# Altium footprint library Semicon-Discrete.pcblib: 205 footprints (part 13 of 13)
Each footprint in its own frame and in the unit in brackets; x right, y up, seen from the top. Pads: shape width x height; smd on the part's side, far side on the other; paste and mask are expansions set on the pad; w line width, h text height; cw(c..) or ccw(c..) is an arc to the next point about the centre after c.
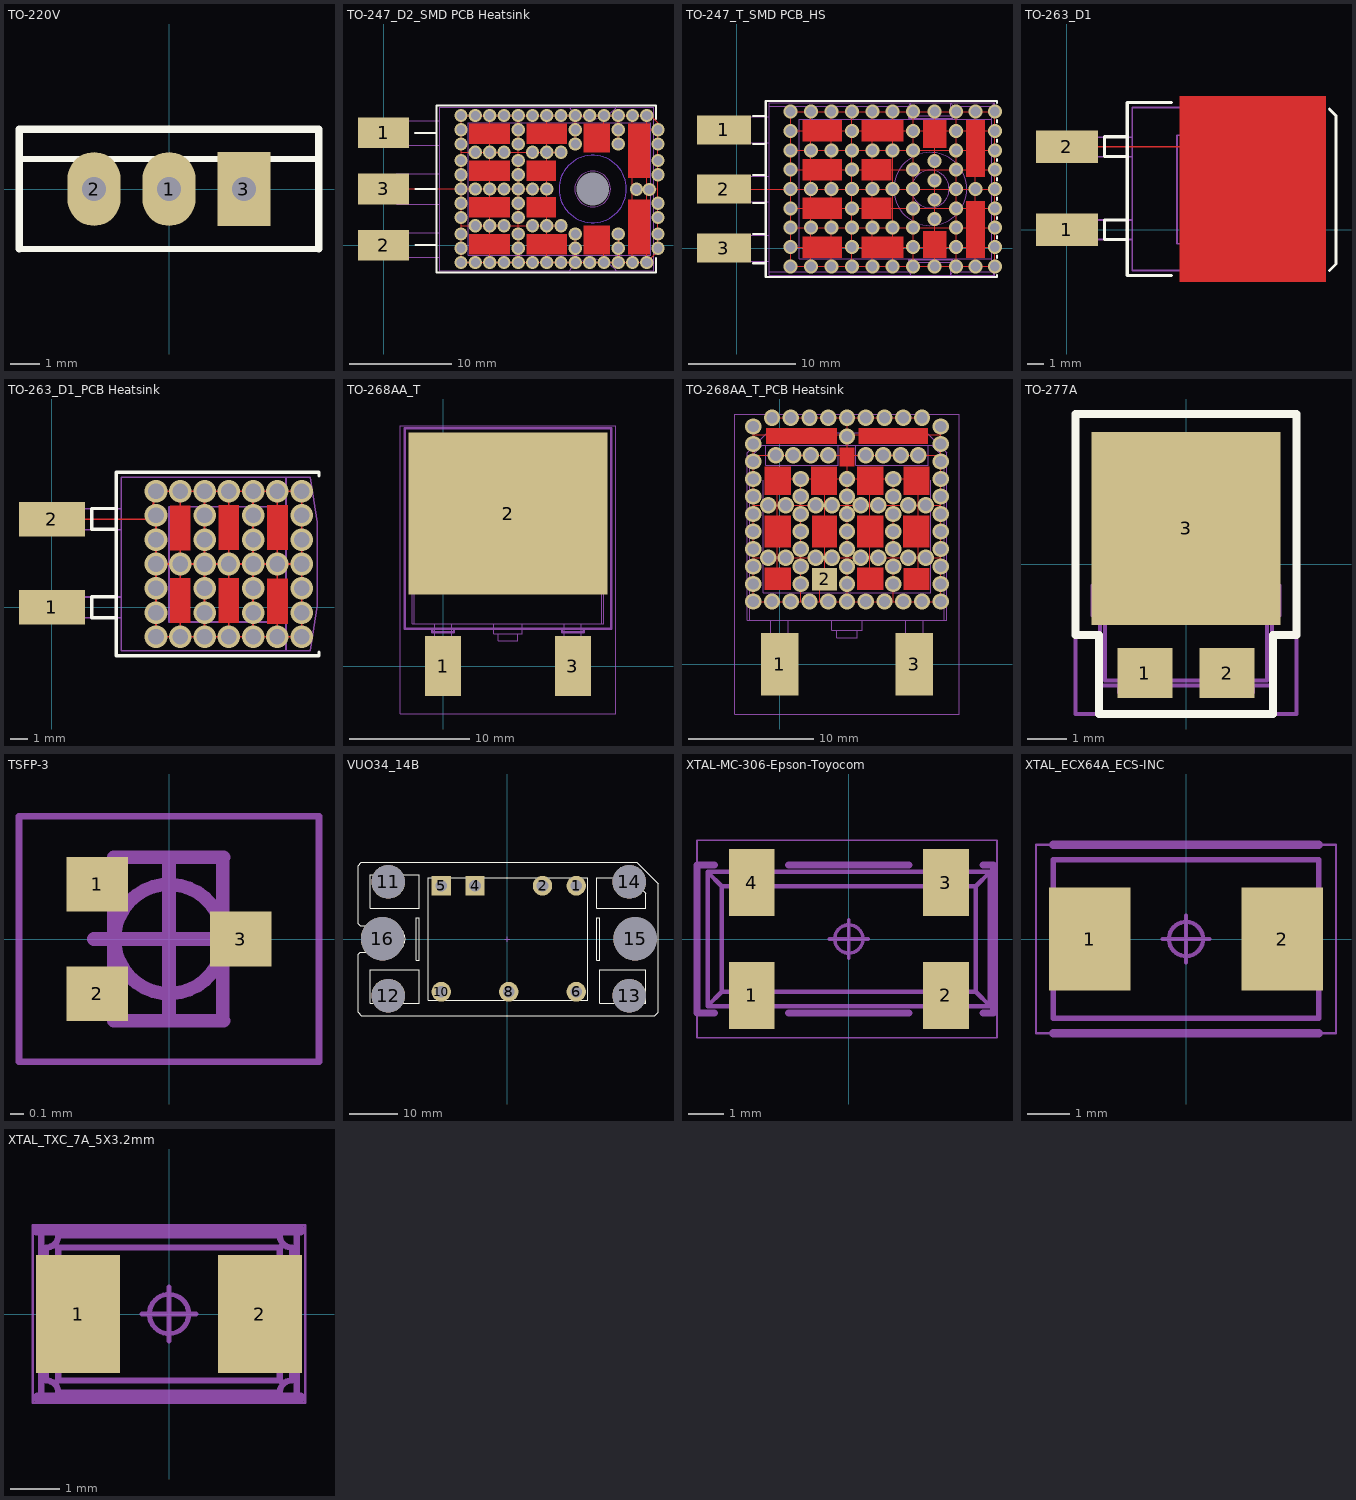
[diagram p12: the footprints below, top view; thin cyan lines are the x and y axes]

## TO-220V [mm]
pads (3):
  oval 1.8x2.5 hole 0.813: 1(0,0) 2(-2.54,0)
  rect 1.8x2.5 hole 0.813: 3(2.54,0)
TopOverlay:
  lines w0.2: -5.08,-2.032 5.08,-2.032 ; -5.08,1.016 5.08,1.016
  lines w0.254: -5.08,-2.032 -5.08,1.016 -5.08,2.032 5.08,2.032 5.08,1.016 5.08,-2.032
4-TopCourty:
  lines w0.1: -0.525,0 0.525,0 ; 0,-0.525 0,0.525
7-TopAssy:
  text ".Designator" at -4.175,-1.575 h2.2

## TO-247_D2_SMD PCB Heatsink [mm]
height 5
pads (4):
  round 0 hole 3.2 unplated: 0(20.5,5.5)
  rect 5x3 smd: 1(0,11) 2(0,0) 3(0,5.5)
via 26.9,-0.3 diameter 1.3 hole 0.9
via 26.9,1.1 diameter 1.3 hole 0.9
via 26.9,2.7 diameter 1.3 hole 0.9
via 26.9,4.1 diameter 1.3 hole 0.9
via 25.8,-1.7 diameter 1.3 hole 0.9
via 24.4,-1.7 diameter 1.3 hole 0.9
via 21.6,-1.7 diameter 1.3 hole 0.9
via 20.2,-1.7 diameter 1.3 hole 0.9
via 20.2,-1.7 diameter 1.3 hole 0.9
via 17.4,-1.7 diameter 1.3 hole 0.9
via 16,-1.7 diameter 1.3 hole 0.9
via 14.6,-1.7 diameter 1.3 hole 0.9
via 11.8,-1.7 diameter 1.3 hole 0.9
via 10.4,-1.7 diameter 1.3 hole 0.9
via 23,-1.7 diameter 1.3 hole 0.9
via 23,-0.3 diameter 1.3 hole 0.9
via 23,1.1 diameter 1.3 hole 0.9
via 18.8,-1.7 diameter 1.3 hole 0.9
via 18.8,-0.3 diameter 1.3 hole 0.9
via 18.8,1.1 diameter 1.3 hole 0.9
via 17.4,1.9 diameter 1.3 hole 0.9
via 16,1.9 diameter 1.3 hole 0.9
via 14.6,1.9 diameter 1.3 hole 0.9
via 11.8,1.9 diameter 1.3 hole 0.9
via 10.4,1.9 diameter 1.3 hole 0.9
via 9,1.9 diameter 1.3 hole 0.9
via 13.2,-1.7 diameter 1.3 hole 0.9
via 13.2,-0.3 diameter 1.3 hole 0.9
via 13.2,1.1 diameter 1.3 hole 0.9
via 13.2,2.7 diameter 1.3 hole 0.9
via 13.2,4.1 diameter 1.3 hole 0.9
via 9,-1.7 diameter 1.3 hole 0.9
via 7.6,-1.7 diameter 1.3 hole 0.9
via 7.6,-0.3 diameter 1.3 hole 0.9
via 7.6,1.1 diameter 1.3 hole 0.9
via 7.6,2.7 diameter 1.3 hole 0.9
via 7.6,4.1 diameter 1.3 hole 0.9
via 26.9,11.3 diameter 1.3 hole 0.9
via 26.9,9.9 diameter 1.3 hole 0.9
via 26.9,8.3 diameter 1.3 hole 0.9
via 26.9,6.9 diameter 1.3 hole 0.9
via 25.8,12.7 diameter 1.3 hole 0.9
via 24.4,12.7 diameter 1.3 hole 0.9
via 21.6,12.7 diameter 1.3 hole 0.9
via 20.2,12.7 diameter 1.3 hole 0.9
via 20.2,12.7 diameter 1.3 hole 0.9
via 17.4,12.7 diameter 1.3 hole 0.9
via 16,12.7 diameter 1.3 hole 0.9
via 14.6,12.7 diameter 1.3 hole 0.9
via 11.8,12.7 diameter 1.3 hole 0.9
via 10.4,12.7 diameter 1.3 hole 0.9
via 23,12.7 diameter 1.3 hole 0.9
via 23,11.3 diameter 1.3 hole 0.9
via 23,9.9 diameter 1.3 hole 0.9
via 18.8,12.7 diameter 1.3 hole 0.9
via 18.8,11.3 diameter 1.3 hole 0.9
via 18.8,9.9 diameter 1.3 hole 0.9
via 17.4,9.1 diameter 1.3 hole 0.9
via 16,9.1 diameter 1.3 hole 0.9
via 14.6,9.1 diameter 1.3 hole 0.9
via 11.8,9.1 diameter 1.3 hole 0.9
via 10.4,9.1 diameter 1.3 hole 0.9
via 9,9.1 diameter 1.3 hole 0.9
via 13.2,12.7 diameter 1.3 hole 0.9
via 13.2,11.3 diameter 1.3 hole 0.9
via 13.2,9.9 diameter 1.3 hole 0.9
via 13.2,8.3 diameter 1.3 hole 0.9
via 13.2,6.9 diameter 1.3 hole 0.9
via 26.05,5.45 diameter 1.3 hole 0.9
via 24.8,5.475 diameter 1.3 hole 0.9
via 16,5.5 diameter 1.3 hole 0.9
via 14.6,5.5 diameter 1.3 hole 0.9
via 13.2,5.5 diameter 1.3 hole 0.9
via 11.8,5.5 diameter 1.3 hole 0.9
via 10.4,5.5 diameter 1.3 hole 0.9
via 9,12.7 diameter 1.3 hole 0.9
via 9,5.5 diameter 1.3 hole 0.9
via 7.6,12.7 diameter 1.3 hole 0.9
via 7.6,11.3 diameter 1.3 hole 0.9
via 7.6,9.9 diameter 1.3 hole 0.9
via 7.6,8.3 diameter 1.3 hole 0.9
via 7.6,6.9 diameter 1.3 hole 0.9
via 7.6,5.5 diameter 1.3 hole 0.9
TopLayer:
  rectangle: 8.4,2.7 12.4,4.7
  rectangle: 8.4,-0.9 12.4,1.1
  rectangle: 14,2.7 16.9,4.7
  rectangle: 14,-0.9 18,1.1
  rectangle: 19.6,-0.9 22.2,1.9
  rectangle: 23.975,-0.9 26.1,4.45
  rectangle: 8.4,6.3 12.4,8.3
  rectangle: 8.4,9.9 12.4,11.9
  rectangle: 14,6.3 16.9,8.3
  rectangle: 14,9.9 18,11.9
  rectangle: 19.6,9.1 22.2,11.9
  rectangle: 23.975,6.6 26.1,11.9
  lines w0.1: 0,5.5 16,5.5 ; 7.6,1.9 9,1.9 17.4,1.9 ; 7.6,9.1 17.4,9.1 ; 10.4,-1.7 10.4,12.7 ; 13.2,-1.7 13.2,12.7 ; 15.4,3.7 16,3.7 16,4.7 ; 15.45,7.3 16,7.3 ; 16,-1.7 16,12.7 ; 18.8,-1.7 18.8,1.1 ; 18.8,9.9 18.8,12.7 ; 20.9,0.5 21.6,0.5 21.6,-1.7 ; 20.9,10.5 21.6,10.5 21.6,11.9 21.6,12.7 ; 23,1.1 23,-1.7 ; 23,9.9 23,12.7 ; 24.4,-1.7 24.4,12.7 ; 24.4,5.5 24.4,5.45 24.8,5.475 25.8,5.5 26.9,5.5 26.9,5.45 ; 25.025,1.775 25.8,1.775 ; 25.025,9.25 25.8,9.25 ; 13.2,12.7 13.2,12.7 ; 16,7.3 16,9.1 ; 16,7.3 16,7.3 ; 16,7.3 16,9.1 ; 16,9.1 16,9.1 ; 23,-1.7 23,-1.7 ; 25.8,-1.7 25.8,12.7 ; 25.8,-1.7 25.8,-1.7 ; 25.8,-1.7 25.8,-1.7 ; 25.8,-1.7 7.6,-1.7 7.6,12.7 25.8,12.7 ; 25.8,-1.7 26.9,-0.6 26.9,-0.3 ; 25.8,12.7 25.8,11.3 26.9,11.3 ; 25.8,12.7 26.2,12.7 26.9,12 26.9,-0.3 ; 26.9,-0.3 26.9,11.3 ; 26.9,11.3 26.9,11.3
TopLayer keep-out:
  circle w0.1: c20.5,5.5 r3.3
BottomLayer keep-out:
  circle w0.1: c20.5,5.5 r3.3
TopOverlay:
  lines w0.2: 3.1,11 5.2,11 ; 3.15,0 5.2,0 ; 3.15,5.5 5.2,5.5 ; 26.7,-1.25 26.7,-2.7 5.2,-2.7 5.2,5.5 ; 26.7,12.35 26.7,13.7 5.2,13.7 5.2,5.5
TopPaste:
  rectangle: 23.9,-0.9 26.1,4.45
  rectangle: 19.6,-0.9 22.2,1.9
  rectangle: 14,-0.9 18,1.1
  rectangle: 14,2.7 16.9,4.7
  rectangle: 8.4,-0.9 12.4,1.1
  rectangle: 8.4,2.7 12.4,4.7
  rectangle: 23.9,6.6 26.1,11.9
  rectangle: 19.6,9.1 22.2,11.9
  rectangle: 14,9.9 18,11.9
  rectangle: 14,6.3 16.95,8.3
  rectangle: 8.4,9.9 12.4,11.9
  rectangle: 8.4,6.3 12.4,8.3
TopSolder:
  region: 12.45,1.15 8.35,1.15 8.35,-0.95 12.45,-0.95
  region: 18.05,1.15 13.95,1.15 13.95,-0.95 18.05,-0.95
  region: 22.25,1.95 19.55,1.95 19.55,-0.95 22.25,-0.95
  region: 26.15,4.65 23.75,4.65 23.75,-0.95 26.15,-0.95
  region: 17.25,4.75 13.95,4.75 13.95,2.65 17.25,2.65
  region: 12.45,4.75 8.35,4.75 8.35,2.65 12.45,2.65
  region: 12.45,11.95 8.35,11.95 8.35,9.85 12.45,9.85
  region: 18.05,11.95 13.95,11.95 13.95,9.85 18.05,9.85
  region: 22.25,11.95 19.55,11.95 19.55,9.05 22.25,9.05
  region: 26.15,11.95 23.75,11.95 23.75,6.35 26.15,6.35
  region: 17.25,8.35 13.95,8.35 13.95,6.25 17.25,6.25
  region: 12.45,8.35 8.35,8.35 8.35,6.25 12.45,6.25
2-TopCompOutl:
  circle w0.1: c20.5,5.5 r1.75
  lines w0.1: 5.5,-1.2 1.3,-1.2 1.3,-0.6 0,-0.6 0,0 0,0.6 1.3,0.6 1.3,1.2 5.5,1.2 ; 5.5,4 1.3,4 1.3,4.9 0,4.9 0,5.5 0,6.1 1.3,6.1 1.3,7 5.5,7 ; 5.5,9.8 1.3,9.8 1.3,10.4 0,10.4 0,11 0,11.6 1.3,11.6 1.3,12.2 5.5,12.2 ; 18.2,-2.5 cw(c20.5,-4.3) 22.836,-2.548 ; 18.2,13.5 ccw(c20.5,15.3) 22.836,13.548 ; 5.5,-2.5 26.5,-2.5 26.5,13.5 5.5,13.5 5.5,-2.5
4-TopCourty:
  lines w0.1: -0.525,0 0.525,0 ; 0,-0.525 0,0.525
5-MCadOutl:
  lines w0.1: 8.3,-1 26.2,-1 26.2,12 8.3,12 8.3,-1
7-TopAssy:
  text ".Designator" at 6.4,2.925 h2.2

## TO-247_T_SMD PCB_HS [mm]
height 5
pads (3):
  rect 5x2.7 smd: 1(-1.2,11) 2(-1.2,5.5) 3(-1.2,0)
via 18.4,12.7 diameter 1.3 hole 0.9
via 24,1.9 diameter 1.3 hole 0.9
via 24,-1.7 diameter 1.3 hole 0.9
via 24,0.1 diameter 1.3 hole 0.9
via 24,5.5 diameter 1.3 hole 0.9
via 24,3.7 diameter 1.3 hole 0.9
via 24,7.3 diameter 1.3 hole 0.9
via 24,9.1 diameter 1.3 hole 0.9
via 24,12.7 diameter 1.3 hole 0.9
via 24,10.9 diameter 1.3 hole 0.9
via 18.4,2.7 diameter 1.3 hole 0.9
via 20.4,1.9 diameter 1.3 hole 0.9
via 20.4,-1.7 diameter 1.3 hole 0.9
via 20.4,0.1 diameter 1.3 hole 0.9
via 20.4,5.5 diameter 1.3 hole 0.9
via 20.4,3.7 diameter 1.3 hole 0.9
via 20.4,7.3 diameter 1.3 hole 0.9
via 20.4,9.1 diameter 1.3 hole 0.9
via 20.4,12.7 diameter 1.3 hole 0.9
via 20.4,10.9 diameter 1.3 hole 0.9
via 16.4,10.9 diameter 1.3 hole 0.9
via 16.4,12.7 diameter 1.3 hole 0.9
via 16.4,9.1 diameter 1.3 hole 0.9
via 16.4,7.3 diameter 1.3 hole 0.9
via 16.4,3.7 diameter 1.3 hole 0.9
via 16.4,5.5 diameter 1.3 hole 0.9
via 16.4,0.1 diameter 1.3 hole 0.9
via 16.4,-1.7 diameter 1.3 hole 0.9
via 16.4,1.9 diameter 1.3 hole 0.9
via 12.6,-1.7 diameter 1.3 hole 0.9
via 14.5,-1.7 diameter 1.3 hole 0.9
via 14.5,1.9 diameter 1.3 hole 0.9
via 12.6,1.9 diameter 1.3 hole 0.9
via 14.5,5.5 diameter 1.3 hole 0.9
via 12.6,5.5 diameter 1.3 hole 0.9
via 14.5,9.1 diameter 1.3 hole 0.9
via 12.6,9.1 diameter 1.3 hole 0.9
via 14.5,12.7 diameter 1.3 hole 0.9
via 12.6,12.7 diameter 1.3 hole 0.9
via 6.9,12.7 diameter 1.3 hole 0.9
via 8.8,12.7 diameter 1.3 hole 0.9
via 6.9,9.1 diameter 1.3 hole 0.9
via 8.8,9.1 diameter 1.3 hole 0.9
via 6.9,5.5 diameter 1.3 hole 0.9
via 8.8,5.5 diameter 1.3 hole 0.9
via 6.9,1.9 diameter 1.3 hole 0.9
via 8.8,1.9 diameter 1.3 hole 0.9
via 8.8,-1.7 diameter 1.3 hole 0.9
via 6.9,-1.7 diameter 1.3 hole 0.9
via 10.7,1.9 diameter 1.3 hole 0.9
via 10.7,-1.7 diameter 1.3 hole 0.9
via 10.7,0.1 diameter 1.3 hole 0.9
via 10.7,5.5 diameter 1.3 hole 0.9
via 10.7,3.7 diameter 1.3 hole 0.9
via 10.7,7.3 diameter 1.3 hole 0.9
via 10.7,9.1 diameter 1.3 hole 0.9
via 10.7,12.7 diameter 1.3 hole 0.9
via 10.7,10.9 diameter 1.3 hole 0.9
via 5,10.9 diameter 1.3 hole 0.9
via 5,12.7 diameter 1.3 hole 0.9
via 5,9.1 diameter 1.3 hole 0.9
via 5,7.3 diameter 1.3 hole 0.9
via 5,3.7 diameter 1.3 hole 0.9
via 18.4,-1.7 diameter 1.3 hole 0.9
via 22.2,-1.7 diameter 1.3 hole 0.9
via 5,5.5 diameter 1.3 hole 0.9
via 5,0.1 diameter 1.3 hole 0.9
via 5,-1.7 diameter 1.3 hole 0.9
via 5,1.9 diameter 1.3 hole 0.9
via 22.2,5.5 diameter 1.3 hole 0.9
via 18.4,4.5 diameter 1.3 hole 0.9
via 18.4,6.3 diameter 1.3 hole 0.9
via 18.4,8.1 diameter 1.3 hole 0.9
via 22.2,12.7 diameter 1.3 hole 0.9
TopLayer:
  rectangle: 6.1,2.7 9.8,4.7
  rectangle: 6.1,-0.9 9.8,1.1
  rectangle: 11.6,2.7 14.4,4.7
  rectangle: 11.6,-0.9 15.5,1.1
  rectangle: 17.3,-0.9 19.5,1.6
  rectangle: 21.3,-0.9 23.1,4.4
  rectangle: 6.1,6.3 9.8,8.3
  rectangle: 6.1,9.9 9.8,11.9
  rectangle: 11.6,6.3 14.4,8.3
  rectangle: 11.6,9.9 15.5,11.9
  rectangle: 17.3,9.3 19.5,11.9
  rectangle: 21.3,6.6 23.1,11.9
  lines w0.1: -1.1,5.5 24,5.5 ; 5,0.1 24,0.1 ; 5,1.9 24,1.9 ; 5,3.7 24,3.7 ; 5,7.3 24,7.3 ; 5,9.1 24,9.1 ; 5,10.9 24,10.9 ; 6.9,-1.7 6.9,12.7 ; 8.8,-1.7 8.8,12.7 ; 10.7,-1.7 10.7,12.7 ; 12.6,-1.7 12.6,12.7 ; 14.5,-1.7 14.5,12.7 ; 16.4,-1.7 16.4,12.7 ; 18.4,-1.7 18.4,12.7 ; 20.4,-1.7 20.4,12.7 ; 22.2,-1.7 22.2,12.7 ; 24,5.5 24,12.7 5,12.7 5,5.5 5,-1.7 24,-1.7 24,5.5
TopOverlay:
  lines w0.2: 1.5,-1.4 2.7,-1.4 ; 1.5,1.3 2.7,1.3 ; 1.5,4.2 2.7,4.2 ; 1.5,6.8 2.7,6.8 ; 1.5,9.7 2.7,9.7 ; 1.5,12.3 2.7,12.3 ; 24.2,-2.5 24.2,-2.7 2.7,-2.7 2.7,4.2 ; 24.2,-0.9 24.2,-0.7 ; 24.2,0.9 24.2,1.1 ; 24.2,2.7 24.2,2.9 ; 24.2,4.5 24.2,4.7 ; 24.2,6.3 24.2,6.5 ; 24.2,8.1 24.2,8.3 ; 24.2,9.9 24.2,10.1 ; 24.2,11.7 24.2,11.9 ; 24.2,13.5 24.2,13.7 2.7,13.7 2.7,4.2
TopPaste:
  rectangle: 21.3,-0.9 23.1,4.4
  rectangle: 17.3,-0.9 19.5,1.6
  rectangle: 11.6,-0.9 15.5,1.1
  rectangle: 11.6,2.7 14.4,4.7
  rectangle: 6.1,-0.9 9.8,1.1
  rectangle: 6.1,2.7 9.8,4.7
  rectangle: 21.3,6.6 23.1,11.9
  rectangle: 17.3,9.3 19.5,11.9
  rectangle: 11.6,9.9 15.5,11.9
  rectangle: 11.6,6.3 14.4,8.3
  rectangle: 6.1,9.9 9.8,11.9
  rectangle: 6.1,6.3 9.8,8.3
TopSolder:
  region: 9.85,1.15 6.05,1.15 6.05,-0.95 9.85,-0.95
  region: 15.55,1.15 11.55,1.15 11.55,-0.95 15.55,-0.95
  region: 19.55,1.65 17.25,1.65 17.25,-0.95 19.55,-0.95
  region: 23.15,4.45 21.25,4.45 21.25,-0.95 23.15,-0.95
  region: 14.45,4.75 11.55,4.75 11.55,2.65 14.45,2.65
  region: 9.85,4.75 6.05,4.75 6.05,2.65 9.85,2.65
  region: 9.85,11.95 6.05,11.95 6.05,9.85 9.85,9.85
  region: 15.55,11.95 11.55,11.95 11.55,9.85 15.55,9.85
  region: 19.55,11.95 17.25,11.95 17.25,9.25 19.55,9.25
  region: 23.15,11.95 21.25,11.95 21.25,6.55 23.15,6.55
  region: 14.45,8.35 11.5,8.35 11.5,6.25 14.45,6.25
  region: 9.85,8.35 6.05,8.35 6.05,6.25 9.85,6.25
2-TopCompOutl:
  circle w0.1: c18,5.5 r1.75
  lines w0.1: -0.8,-0.6 -0.8,0.6 ; -0.8,4.9 -0.8,6.1 ; -0.8,10.4 -0.8,11.6 ; 0,-1.2 0,1.2 ; 0,4.3 0,6.7 ; 0,9.8 0,12.2 ; 3,-2.2 16,-2.2 ; 3,-1.2 -0.6,-1.2 -0.6,-0.6 -2.5,-0.6 -2.5,0.6 -0.6,0.6 -0.6,1.2 3,1.2 ; 3,4.3 -0.6,4.3 -0.6,4.9 -2.5,4.9 -2.5,6.1 -0.6,6.1 -0.6,6.7 3,6.7 ; 3,9.8 -0.6,9.8 -0.6,10.4 -2.5,10.4 -2.5,11.6 -0.6,11.6 -0.6,12.2 3,12.2 ; 3,13.2 16,13.2 ; 16,-2.2 16,-1.1 ; 16,-2.2 16.2,-2.5 16.2,-1.3 ; 16,-1.1 20.1,-1.1 ; 16,-1.1 16.2,-1.3 ; 16,12.1 16.2,12.3 ; 16,12.1 20.1,12.1 ; 16,12.1 16,13.2 ; 16,13.2 16.2,13.5 16.2,12.3 ; 16.2,-1.3 19.9,-1.3 ; 16.2,12.3 19.9,12.3 ; 19.9,-1.3 19.9,-2.5 20.1,-2.2 ; 19.9,-1.3 20.1,-1.1 ; 19.9,12.3 20.1,12.1 ; 19.9,12.3 19.9,13.5 20.1,13.2 ; 20.1,-2.2 23.7,-2.2 ; 20.1,-2.2 20.1,-1.1 ; 20.1,12.1 20.1,13.2 ; 20.1,13.2 23.7,13.2 ; 23.7,-2.2 23.7,13.2 ; 23.7,-2.2 24,-2.5 ; 23.7,13.2 24,13.5 ; 24,-2.5 24,13.5 ; 24,-2.5 3,-2.5 3,13.5 24,13.5
  text ".Designator" at 5.25,4.8 h2.2
4-TopCourty:
  lines w0.1: -3.025,0 -1.975,0 ; -2.5,-0.525 -2.5,0.525
5-MCadOutl:
  circle w0.1: c18,5.5 r3.4
  lines w0.1: 5.8,-1 23.7,-1 23.7,12 5.8,12 5.8,-1
7-TopAssy:
  circle w0.1: c18,5.5 r1.75
  lines w0.1: -0.8,-0.6 -0.8,0.6 ; -0.8,4.9 -0.8,6.1 ; -0.8,10.4 -0.8,11.6 ; 0,-1.2 0,1.2 ; 0,4.3 0,6.7 ; 0,9.8 0,12.2 ; 3,-2.2 16,-2.2 ; 3,-1.2 -0.6,-1.2 -0.6,-0.6 -2.5,-0.6 -2.5,0.6 -0.6,0.6 -0.6,1.2 3,1.2 ; 3,4.3 -0.6,4.3 -0.6,4.9 -2.5,4.9 -2.5,6.1 -0.6,6.1 -0.6,6.7 3,6.7 ; 3,9.8 -0.6,9.8 -0.6,10.4 -2.5,10.4 -2.5,11.6 -0.6,11.6 -0.6,12.2 3,12.2 ; 3,13.2 16,13.2 ; 16,-2.2 16,-1.1 ; 16,-2.2 16.2,-2.5 16.2,-1.3 ; 16,-1.1 20.1,-1.1 ; 16,-1.1 16.2,-1.3 ; 16,12.1 16.2,12.3 ; 16,12.1 20.1,12.1 ; 16,12.1 16,13.2 ; 16,13.2 16.2,13.5 16.2,12.3 ; 16.2,-1.3 19.9,-1.3 ; 16.2,12.3 19.9,12.3 ; 19.9,-1.3 19.9,-2.5 20.1,-2.2 ; 19.9,-1.3 20.1,-1.1 ; 19.9,12.3 20.1,12.1 ; 19.9,12.3 19.9,13.5 20.1,13.2 ; 20.1,-2.2 23.7,-2.2 ; 20.1,-2.2 20.1,-1.1 ; 20.1,12.1 20.1,13.2 ; 20.1,13.2 23.7,13.2 ; 23.7,-2.2 23.7,13.2 ; 23.7,-2.2 24,-2.5 ; 23.7,13.2 24,13.5 ; 24,-2.5 24,13.5 ; 24,-2.5 3,-2.5 3,13.5 24,13.5
  text ".Designator" at 5.25,4.8 h2.2
16-Mechanical16:
  circle w0.1: c18,5.5 r1.75
  circle w0.1: c-2.5,11 r0.7
  circle w0.1: c-2.5,5.5 r0.7
  circle w0.1: c-2.5,0 r0.7
3D body "TO-247_T_SMD PCB_HS.STEP": height 5, standoff -0.15, extent -2.5,-2.6 24.4,13.6

## TO-263_D1 [mm]
height 4.5
pads (2):
  rect 3.8x2 smd: 1(0,0) 2(0,5.08)
TopLayer:
  region: 15.9,8.2 6.9,8.2 6.9,-3.2 15.9,-3.2
  lines w0.1: 0,5.08 11.4,5.1
TopOverlay:
  lines w0.2: 3.7,-0.6 2.3,-0.6 2.3,0.6 3.7,0.6 ; 3.7,4.5 2.3,4.5 2.3,5.7 3.7,5.7 ; 6.4,-2.8 3.7,-2.8 3.7,-0.9 3.7,5.9 3.7,7.8 6.4,7.8 ; 16.1,-2.5 16.5,-2.1 16.5,7 16.1,7.4
TopPaste:
  region: 15.9,8.2 6.9,8.2 6.9,-3.2 15.9,-3.2
TopSolder:
  region: 16,8.3 6.8,8.3 6.8,-3.3 16,-3.3
2-TopCompOutl:
  lines w0.1: 4,-0.6 1.4,-0.6 1.4,-0.4 0,-0.4 0,0.4 1.4,0.4 1.4,0.6 4,0.6 ; 4,4.48 1.4,4.48 1.4,4.68 0,4.68 0,5.48 1.4,5.48 1.4,5.68 4,5.68 ; 13.5,-2.5 13.5,7.5 ; 4,-2.5 14.9,-2.5 15.3,0.1 15.3,4.7 15.3,4.9 14.9,7.5 4,7.5 4,-2.5
4-TopCourty:
  lines w0.1: -0.525,0 0.525,0 ; 0,-0.525 0,0.525
5-MCadOutl:
  lines w0.1: 13.5,-2.45 13.5,-0.85 6.75,-0.85 6.75,5.8 13.5,5.8 13.5,7.5
7-TopAssy:
  text ".Designator" at 4.5,1.8 h2.2

## TO-263_D1_PCB Heatsink [mm]
height 4.5
pads (2):
  rect 3.8x2 smd: 1(0,0) 2(0,5.08)
via 14.4,1.1 diameter 1.3 hole 0.9
via 14.4,-0.3 diameter 1.3 hole 0.9
via 14.4,-1.7 diameter 1.3 hole 0.9
via 13,-1.7 diameter 1.3 hole 0.9
via 11.6,1.1 diameter 1.3 hole 0.9
via 11.6,-0.3 diameter 1.3 hole 0.9
via 11.6,-1.7 diameter 1.3 hole 0.9
via 10.2,-1.7 diameter 1.3 hole 0.9
via 7.4,-1.7 diameter 1.3 hole 0.9
via 8.8,-1.7 diameter 1.3 hole 0.9
via 8.8,-0.3 diameter 1.3 hole 0.9
via 8.8,1.1 diameter 1.3 hole 0.9
via 6,-1.7 diameter 1.3 hole 0.9
via 6,-0.3 diameter 1.3 hole 0.9
via 6,1.1 diameter 1.3 hole 0.9
via 14.4,3.9 diameter 1.3 hole 0.9
via 14.4,5.3 diameter 1.3 hole 0.9
via 14.4,6.7 diameter 1.3 hole 0.9
via 13,6.7 diameter 1.3 hole 0.9
via 11.6,3.9 diameter 1.3 hole 0.9
via 11.6,5.3 diameter 1.3 hole 0.9
via 11.6,6.7 diameter 1.3 hole 0.9
via 10.2,6.7 diameter 1.3 hole 0.9
via 7.4,6.7 diameter 1.3 hole 0.9
via 8.8,6.7 diameter 1.3 hole 0.9
via 8.8,5.3 diameter 1.3 hole 0.9
via 8.8,3.9 diameter 1.3 hole 0.9
via 14.4,2.5 diameter 1.3 hole 0.9
via 13,2.5 diameter 1.3 hole 0.9
via 11.6,2.5 diameter 1.3 hole 0.9
via 10.2,2.5 diameter 1.3 hole 0.9
via 8.8,2.5 diameter 1.3 hole 0.9
via 7.4,2.5 diameter 1.3 hole 0.9
via 6,6.7 diameter 1.3 hole 0.9
via 6,5.3 diameter 1.3 hole 0.9
via 6,3.9 diameter 1.3 hole 0.9
via 6,2.5 diameter 1.3 hole 0.9
TopLayer:
  region: 13.6,1.65 12.4,1.65 12.4,-0.95 13.6,-0.95
  region: 10.8,1.7 9.6,1.7 9.6,-0.9 10.8,-0.9
  region: 8,1.7 6.8,1.7 6.8,-0.9 8,-0.9
  region: 13.6,5.9 12.4,5.9 12.4,3.3 13.6,3.3
  region: 10.8,5.9 9.6,5.9 9.6,3.3 10.8,3.3
  region: 8,5.875 6.8,5.875 6.8,3.275 8,3.275
  lines w0.1: 0,5.08 5.65,5.075 6,6.7 14.4,6.7 ; 6,2.5 14.4,2.5 ; 6,5.5 6,-1.7 ; 7.4,-1.7 7.4,6.7 ; 8.8,-1.7 8.8,6.7 ; 10.2,-1.7 10.2,6.7 ; 13,-1.7 13,6.7 ; 6,-1.7 14.4,-1.7 ; 6,-1.7 14.4,-1.7 ; 7.4,6.7 7.4,6.7 ; 7.4,6.7 7.4,6.7 ; 8.8,6.7 8.8,6.7 ; 11.6,-1.7 11.6,-1.7 ; 11.6,-1.7 11.6,6.7 ; 11.6,6.7 11.6,6.7 ; 13,6.7 13,6.7 ; 13,6.7 13,6.7 ; 14.4,-1.7 14.4,-1.7 ; 14.4,-1.7 14.4,6.7 ; 14.4,6.7 14.4,6.7
TopOverlay:
  lines w0.2: 3.7,-0.6 2.3,-0.6 2.3,0.6 3.7,0.6 ; 3.7,4.5 2.3,4.5 2.3,5.7 3.7,5.7 ; 15.4,-2.6 15.4,-2.8 3.7,-2.8 3.7,-0.9 3.7,5.9 3.7,7.8 15.4,7.8 15.4,7.6
TopPaste:
  region: 8,5.9 6.8,5.9 6.8,3.3 8,3.3
  region: 10.8,5.9 9.6,5.9 9.6,3.3 10.8,3.3
  region: 13.6,5.9 12.4,5.9 12.4,3.3 13.6,3.3
  region: 8,1.7 6.8,1.7 6.8,-0.9 8,-0.9
  region: 10.8,1.7 9.6,1.7 9.6,-0.9 10.8,-0.9
  region: 13.6,1.7 12.4,1.7 12.4,-0.9 13.6,-0.9
TopSolder:
  region: 8.05,5.95 6.75,5.95 6.75,3.25 8.05,3.25
  region: 10.85,5.95 9.55,5.95 9.55,3.25 10.85,3.25
  region: 13.65,5.95 12.35,5.95 12.35,3.25 13.65,3.25
  region: 8.05,1.75 6.75,1.75 6.75,-0.95 8.05,-0.95
  region: 10.85,1.8 9.55,1.8 9.55,-0.95 10.85,-0.95
  region: 13.65,1.75 12.35,1.75 12.35,-0.95 13.65,-0.95
2-TopCompOutl:
  lines w0.1: 4,-0.6 1.4,-0.6 1.4,-0.4 0,-0.4 0,0.4 1.4,0.4 1.4,0.6 4,0.6 ; 4,4.48 1.4,4.48 1.4,4.68 0,4.68 0,5.48 1.4,5.48 1.4,5.68 4,5.68 ; 13.5,-2.5 13.5,7.5 ; 4,-2.5 4,7.5 14.9,7.5 15.3,4.9 15.3,4.7 15.3,0.1 14.9,-2.5 4,-2.5
4-TopCourty:
  lines w0.1: -0.525,0 0.525,0 ; 0,-0.525 0,0.525
5-MCadOutl:
  lines w0.1: 13.5,-2.45 13.5,-0.85 6.75,-0.85 6.75,5.8 13.5,5.8 13.5,7.5
7-TopAssy:
  text ".Designator" at 4.375,1.95 h2.2

## TO-268AA_T [mm]
height 5
pads (3):
  rect 3x5 smd: 1(0,0) 3(10.8,0)
  rect 16.6x13.5 smd: 2(5.4,12.7)
2-TopCompOutl:
  lines w0.1: -2.6,16.7 -2.4,16.5 ; -2.4,3.5 -2.4,16.5 ; -0.7,2.1 0.7,2.1 ; -0.7,3.5 -0.7,-0.4 0.7,-0.4 0.7,3.5 ; 4.2,3.5 4.2,2.7 4.6,2.7 ; 6.6,3.5 6.6,2.7 6.2,2.7 ; 10.1,2.1 11.5,2.1 ; 10.1,3.5 10.1,-0.4 11.5,-0.4 11.5,3.5 ; 13.2,3.5 13.2,16.5 ; 13.4,16.7 13.2,16.5 ; -2.4,16.5 -1.4,17.5 12.2,17.5 13.2,16.5 ; 4.6,2.7 6.2,2.7 ; 4.6,2.7 4.6,2.1 5.4,2.1 6.2,2.1 6.2,2.7 ; -2.6,3.5 13.4,3.5 13.4,16.9 11.8,18.5 -1,18.5 -2.6,16.9 -2.6,3.5
4-TopCourty:
  lines w0.05: -3.6,-4 -3.6,20 14.4,20 14.4,-4 -3.6,-4
  lines w0.1: -0.525,0 0.525,0 ; 0,-0.525 0,0.525
7-TopAssy:
  text ".Designator" at 0.125,6.55 h2.2
13-SMDTopOverlay:
  lines w0.2: -0.9,3.1 -0.9,2.8 0.9,2.8 0.9,3.1 ; 9.9,3.1 9.9,2.8 11.7,2.8 11.7,3.1 ; -3.2,3.1 14,3.1 14,19.8 -3.2,19.8 -3.2,3.1

## TO-268AA_T_PCB Heatsink [mm]
pads (3):
  rect 3x5 smd: 1(0,0) 3(10.8,0)
  rect 2x1.8 smd: 2(3.6,6.8)
via -2.1,10.6 diameter 1.3 hole 0.9
via -2.1,12 diameter 1.3 hole 0.9
via -2.1,9.2 diameter 1.3 hole 0.9
via 12.9,10.6 diameter 1.3 hole 0.9
via 12.9,12 diameter 1.3 hole 0.9
via 12.9,9.2 diameter 1.3 hole 0.9
via 5.4,18.2 diameter 1.3 hole 0.9
via -2.1,13.4 diameter 1.3 hole 0.9
via -2.1,7.8 diameter 1.3 hole 0.9
via -2.1,6.4 diameter 1.3 hole 0.9
via -2.1,5 diameter 1.3 hole 0.9
via -0.6,5 diameter 1.3 hole 0.9
via 0.9,5 diameter 1.3 hole 0.9
via 2.4,5 diameter 1.3 hole 0.9
via 3.9,5 diameter 1.3 hole 0.9
via 5.4,5 diameter 1.3 hole 0.9
via 6.9,5 diameter 1.3 hole 0.9
via 8.4,5 diameter 1.3 hole 0.9
via 9.9,5 diameter 1.3 hole 0.9
via 11.4,5 diameter 1.3 hole 0.9
via 12.9,13.4 diameter 1.3 hole 0.9
via 12.9,7.8 diameter 1.3 hole 0.9
via 12.9,6.4 diameter 1.3 hole 0.9
via 12.9,5 diameter 1.3 hole 0.9
via -2.1,19 diameter 1.3 hole 0.9
via -2.1,17.6 diameter 1.3 hole 0.9
via -2.1,16.2 diameter 1.3 hole 0.9
via -2.1,14.8 diameter 1.3 hole 0.9
via 12.9,19 diameter 1.3 hole 0.9
via 12.9,17.6 diameter 1.3 hole 0.9
via 12.9,16.2 diameter 1.3 hole 0.9
via 12.9,14.8 diameter 1.3 hole 0.9
via 1.7,14.8 diameter 1.3 hole 0.9
via 1.7,13.4 diameter 1.3 hole 0.9
via 1.7,12 diameter 1.3 hole 0.9
via 1.7,10.6 diameter 1.3 hole 0.9
via 1.7,9.2 diameter 1.3 hole 0.9
via 1.7,7.8 diameter 1.3 hole 0.9
via 1.7,6.4 diameter 1.3 hole 0.9
via 9.1,14.8 diameter 1.3 hole 0.9
via 9.1,13.4 diameter 1.3 hole 0.9
via 9.1,12 diameter 1.3 hole 0.9
via 9.1,10.6 diameter 1.3 hole 0.9
via 9.1,9.2 diameter 1.3 hole 0.9
via 9.1,7.8 diameter 1.3 hole 0.9
via 9.1,6.4 diameter 1.3 hole 0.9
via 5.4,14.8 diameter 1.3 hole 0.9
via 5.4,13.4 diameter 1.3 hole 0.9
via 5.4,12 diameter 1.3 hole 0.9
via 5.4,10.6 diameter 1.3 hole 0.9
via 5.4,9.2 diameter 1.3 hole 0.9
via 5.4,7.8 diameter 1.3 hole 0.9
via 5.4,6.4 diameter 1.3 hole 0.9
via 2.9,8.5 diameter 1.3 hole 0.9
via 4.2,8.5 diameter 1.3 hole 0.9
via -0.3,16.7 diameter 1.3 hole 0.9
via 1.1,16.7 diameter 1.3 hole 0.9
via 2.5,16.7 diameter 1.3 hole 0.9
via 3.9,16.7 diameter 1.3 hole 0.9
via 6.9,16.7 diameter 1.3 hole 0.9
via 8.3,16.7 diameter 1.3 hole 0.9
via 9.7,16.7 diameter 1.3 hole 0.9
via 11.1,16.7 diameter 1.3 hole 0.9
via -0.9,8.5 diameter 1.3 hole 0.9
via 0.5,8.5 diameter 1.3 hole 0.9
via 7.9,8.5 diameter 1.3 hole 0.9
via 6.5,8.5 diameter 1.3 hole 0.9
via 11.7,8.5 diameter 1.3 hole 0.9
via 10.3,8.5 diameter 1.3 hole 0.9
via 2.9,12.7 diameter 1.3 hole 0.9
via 4.2,12.7 diameter 1.3 hole 0.9
via -0.9,12.7 diameter 1.3 hole 0.9
via 0.5,12.7 diameter 1.3 hole 0.9
via 7.9,12.7 diameter 1.3 hole 0.9
via 6.5,12.7 diameter 1.3 hole 0.9
via 11.7,12.7 diameter 1.3 hole 0.9
via 10.3,12.7 diameter 1.3 hole 0.9
via -0.6,19.7 diameter 1.3 hole 0.9
via 0.9,19.7 diameter 1.3 hole 0.9
via 2.4,19.7 diameter 1.3 hole 0.9
via 3.9,19.7 diameter 1.3 hole 0.9
via 5.4,19.7 diameter 1.3 hole 0.9
via 6.9,19.7 diameter 1.3 hole 0.9
via 8.4,19.7 diameter 1.3 hole 0.9
via 9.9,19.7 diameter 1.3 hole 0.9
via 11.4,19.7 diameter 1.3 hole 0.9
TopLayer:
  rectangle: -1.2,5.9 0.9,7.7
  region: 8.3,7.7 6.2,7.7 6.2,5.9 8.3,5.9
  region: 12,7.7 9.9,7.7 9.9,5.9 12,5.9
  rectangle: -1.2,9.3 0.9,11.9
  rectangle: 2.6,9.3 4.6,11.9
  rectangle: 6.2,9.3 8.3,11.9
  rectangle: 9.9,9.3 12,11.9
  rectangle: -1.2,13.5 0.9,15.8
  rectangle: 2.5,13.5 4.6,15.8
  rectangle: 6.2,13.5 8.3,15.8
  rectangle: 9.9,13.5 12,15.8
  rectangle: 4.8,15.8 6,17.3
  rectangle: -1.1,17.6 4.6,18.9
  rectangle: 6.3,17.6 11.9,18.9
  lines w0.1: -2.1,9.2 -2.1,8.5 12.9,8.5 ; -2.1,12.7 12.9,12.7 12.9,13.4 ; -2.1,16.9 -2.1,16.7 -0.3,16.7 3.9,16.7 11.1,16.7 12.9,16.7 12.9,16.2 ; -0.6,19.7 11.4,19.7 ; -0.2,6.8 -0.2,15 ; -0.2,14.8 9.1,14.8 ; 1.6,5 1.7,5 1.7,14.8 1.7,6.4 ; 3.2,5 3.2,6.8 3.6,6.8 3.6,14.8 ; 5.4,5 5.4,19.7 ; 7.2,6.6 7.2,14.8 7.3,14.8 ; 9.1,5 9.1,14.8 ; 11.1,6.7 11.1,14.8 9.1,14.8 ; -2.1,5 12.9,5 12.9,19 12.9,18.35 -2.1,18.35 -2.1,19 -2.1,5
TopPaste:
  rectangle: 6.3,17.6 11.9,18.9
  rectangle: -1.1,17.6 4.6,18.9
  rectangle: 4.8,15.8 6,17.3
  rectangle: 9.9,13.5 12,15.8
  rectangle: 6.2,13.5 8.3,15.8
  rectangle: 2.5,13.5 4.6,15.8
  rectangle: -1.2,13.5 0.9,15.8
  rectangle: 9.9,9.3 12,11.9
  rectangle: 6.2,9.3 8.3,11.9
  rectangle: 2.6,9.3 4.6,11.9
  rectangle: -1.2,9.3 0.9,11.9
  region: 12,7.7 9.9,7.7 9.9,5.9 12,5.9
  region: 8.3,7.7 6.2,7.7 6.2,5.9 8.3,5.9
  rectangle: -1.2,5.9 0.9,7.7
TopSolder:
  rectangle: 6.25,17.55 11.95,18.95
  rectangle: 4.75,15.75 6.05,17.35
  rectangle: -1.1,17.55 4.65,18.95
  rectangle: -1.25,13.45 0.95,15.85
  rectangle: 2.45,13.45 4.65,15.85
  rectangle: 6.15,13.45 8.35,15.85
  rectangle: 9.85,13.45 12.05,15.85
  rectangle: 9.85,9.25 12.05,11.95
  rectangle: 6.15,9.3 8.3,11.95
  rectangle: 2.55,9.3 4.65,11.95
  rectangle: -1.25,9.25 0.95,11.95
  rectangle: -1.25,5.85 0.95,7.75
  rectangle: 6.15,5.85 8.35,7.75
  rectangle: 9.85,5.85 12.05,7.75
2-TopCompOutl:
  lines w0.1: -2.6,16.7 -2.4,16.5 ; -2.4,3.5 -2.4,16.5 ; -0.7,2.1 0.7,2.1 ; -0.7,3.5 -0.7,-0.4 0.7,-0.4 0.7,3.5 ; 4.2,3.5 4.2,2.7 4.6,2.7 ; 6.6,3.5 6.6,2.7 6.2,2.7 ; 10.1,2.1 11.5,2.1 ; 10.1,3.5 10.1,-0.4 11.5,-0.4 11.5,3.5 ; 13.2,3.5 13.2,16.5 ; 13.4,16.7 13.2,16.5 ; -2.4,16.5 -1.4,17.5 12.2,17.5 13.2,16.5 ; 4.6,2.7 4.6,2.1 5.4,2.1 6.2,2.1 6.2,2.7 ; 4.6,2.7 6.2,2.7 ; -2.6,3.5 -2.6,16.9 -1,18.5 11.8,18.5 13.4,16.9 13.4,3.5 -2.6,3.5
4-TopCourty:
  lines w0.05: -3.6,-4 14.4,-4 14.4,20 -3.6,20 -3.6,-4
  lines w0.1: -0.525,0 0.525,0 ; 0,-0.525 0,0.525
5-MCadOutl:
  lines w0.1: -1.3,14.7 -1.3,5.7 12.1,5.7 12.1,14.7 ; -1.1,15.9 4.7,15.9 4.7,17.5 -1.1,17.5 -1.1,15.9 ; 6.1,15.9 11.9,15.9 11.9,17.5 6.1,17.5 6.1,15.9
7-TopAssy:
  text ".Designator" at -0.3,8.25 h2.2

## TO-277A [mm]
height 1.2
pads (3):
  rect 1.4x1.27 smd: 1(-1.04,-2.765) 2(1.04,-2.765)
  rect 4.8x4.9 smd: 3(0,0.9)
TopOverlay:
  lines w0.2: -2.8,-1.8 -2.8,3.8 -1.5,3.8 -0.1,3.8 0,3.8 0.1,3.8 1.5,3.8 2.8,3.8 2.8,-1.8 2.2,-1.8 2.2,-3.8 0,-3.8 -2.2,-3.8 -2.2,-1.8 -2.8,-1.8
2-TopCompOutl:
  lines w0.05: -2.175,-1.3 -2.375,-1.3 -2.375,-0.55 -2.175,-0.55 ; -1.7,-3.075 -1.7,-3.25 -0.4,-3.25 -0.4,-3.075 ; -1.1,3.075 -1.1,3.25 0,3.25 1.1,3.25 1.1,3.075 ; 0.4,-3.075 0.4,-3.25 1.7,-3.25 1.7,-3.075 ; 2.175,-1.3 2.375,-1.3 2.375,-0.55 2.175,-0.55 ; -2.175,-3.075 -2.175,0 -2.175,3.075 0,3.075 2.175,3.075 2.175,0 2.175,-3.075 0,-3.075 -2.175,-3.075
4-TopCourty:
  lines w0.1: -0.7,0 0.7,0 ; 0,-0.7 0,0.7 ; -2.8,-3.8 -2.8,3.8 2.8,3.8 2.8,-3.8 -2.8,-3.8
7-TopAssy:
  lines w0.1: -2.175,-1.3 -2.375,-1.3 -2.375,-0.55 -2.175,-0.55 ; -1.7,-3.075 -1.7,-3.25 -0.4,-3.25 -0.4,-3.075 ; -1.1,3.075 -1.1,3.25 0,3.25 1.1,3.25 1.1,3.075 ; 0.4,-3.075 0.4,-3.25 1.7,-3.25 1.7,-3.075 ; 2.175,-1.3 2.375,-1.3 2.375,-0.55 2.175,-0.55 ; -2.175,-3.075 0,-3.075 2.175,-3.075 2.175,0 2.175,3.075 0,3.075 -2.175,3.075 -2.175,0 -2.175,-3.075 ; -2.05,-2.95 -2.05,2.975 0,2.975 2.05,2.975 2.05,-2.95 0,-2.95 -2.05,-2.95
  text ".Designator" at -1.475,-0.475 h1.8
3D body "TO-277A.STEP": height 1.25, standoff 0, extent -2.375,-3.375 2.375,3.275

## TSFP-3 [mm] "TSFP-3 (Infineon)"
height 0.6
pads (3):
  rect 0.45x0.4 smd: 1(-0.525,0.4) 2(-0.525,-0.4) 3(0.525,0)
2-TopCompOutl:
  lines w0.1: -0.405,-0.5 -0.405,-0.6 0.395,-0.6 0.395,-0.1 ; -0.405,-0.5 -0.405,-0.3 ; -0.405,-0.5 -0.605,-0.5 -0.605,-0.3 -0.405,-0.3 ; -0.405,-0.3 -0.405,0.3 ; -0.405,0.3 -0.405,0.5 ; -0.405,0.3 -0.605,0.3 -0.605,0.5 -0.405,0.5 ; -0.405,0.5 -0.405,0.6 0.395,0.6 0.395,0.1 ; 0.395,-0.1 0.395,0.1 ; 0.395,-0.1 0.595,-0.1 0.595,0.1 0.395,0.1
4-TopCourty:
  circle w0.1: c0,0 r0.4
  lines w0.05: -1.1,-0.9 1.1,-0.9 1.1,0.9 -1.1,0.9 -1.1,-0.9
  lines w0.1: -0.55,0 0.55,0 ; 0,-0.575 0,0.575
7-TopAssy:
  lines w0.1: -0.405,-0.6 -0.405,-0.5 ; -0.405,0.6 -0.405,0.5 ; 0.395,-0.6 0.395,-0.1 ; 0.395,0.6 0.395,0.1 ; -0.405,-0.5 -0.605,-0.5 -0.605,-0.3 -0.405,-0.3 ; -0.405,-0.5 -0.405,-0.3 ; -0.405,-0.3 -0.405,0.3 ; -0.405,0.3 -0.605,0.3 -0.605,0.5 -0.405,0.5 ; -0.405,0.3 -0.405,0.5 ; 0.395,-0.1 0.595,-0.1 0.595,0.1 0.395,0.1 ; 0.395,-0.1 0.395,0.1
  text ".Designator" at -0.8,0.7 h1.5
13-SMDTopOverlay:
  lines w0.1: 0,-0.6 0.4,-0.6 ; 0,0.6 0.4,0.6
3D body "TSFP-3.STEP": height 0.6, standoff 0, extent -0.6,-0.6 0.6,0.6

## VUO34_14B [mm]
pads (13):
  oval 4x4.1 hole 2.4: 1(14.321,11.102) 2(7.321,11.102) 6(14.321,-10.898) 8(0.321,-10.898) 10(-13.679,-10.898)
  rect 4x4.1 hole 2.4: 4(-6.679,11.102) 5(-13.679,11.102)
  round 7 hole 7 unplated: 11(-24.679,11.902) 12(-24.679,-11.698) 13(25.321,-11.698) 14(25.321,11.902)
  round 9 hole 9 unplated: 15(26.521,0.102)
  round 9 hole 9: 16(-25.879,0.102)
TopOverlay:
  lines w0.1: 29.318,-0.02 cw(c26.521,0.102) 29.318,-0.015 ; -30.955,-15.189 -30.955,-3.124 -30.447,-2.743 -23.97,-2.743 ccw(c-23.97,0.051) -23.97,2.845 -30.447,2.845 -30.955,3.226 -30.955,15.291 -30.32,15.926 26.83,15.926 31.275,11.481 31.275,-15.189 30.64,-15.824 -30.32,-15.824 -30.955,-15.189 ; -28.415,-13.284 -28.415,-6.299 -18.255,-6.299 -18.255,-13.284 -28.415,-13.284 ; -28.415,6.401 -28.415,13.386 -18.255,13.386 -18.255,6.401 -28.415,6.401 ; -18.89,-4.394 -18.255,-4.394 -18.255,0.051 -18.255,4.496 -18.89,4.496 -18.89,0.051 -18.89,-4.394 ; -16.35,-12.649 -16.35,12.751 16.67,12.751 16.67,-12.649 -16.35,-12.649 ; 18.575,-4.394 18.575,4.496 19.21,4.496 19.21,-4.394 18.575,-4.394 ; 18.575,6.401 28.735,6.401 28.735,9.576 25.56,12.751 18.575,12.751 18.575,6.401 ; 19.21,-13.284 28.735,-13.284 28.735,-6.299 19.21,-6.299 19.21,-13.284
4-TopCourty:
  lines w0.1: -0.525,0 0.525,0 ; 0,-0.525 0,0.525
7-TopAssy:
  text ".Designator" at -6.675,2.3 h2.2

## XTAL-MC-306-Epson-Toyocom [mm] "Epson-Toyocom Crystal MC-306"
height 2.54
pads (4):
  rect 1.3x1.9 smd: 1(-2.75,-1.6) 2(2.75,-1.6) 3(2.75,1.6) 4(-2.75,1.6)
2-TopCompOutl:
  lines w0.127: -3.001,1.9 -3.001,1.91 -2.5,1.91 -2.5,1.9 ; -3,-1.9 -3,-1.91 -2.5,-1.91 -2.5,-1.9 ; 2.498,1.9 2.498,1.91 3,1.91 3,1.9 ; 2.5,-1.9 2.5,-1.91 3,-1.91 3,-1.9 ; -4,-1.9 -3.598,-1.498 ; -4,-1.9 -4,1.9 ; -4,-1.9 4,-1.9 ; -4,1.9 -3.598,1.498 ; -4,1.9 4,1.9 ; -3.598,-1.498 -3.598,1.498 ; -3.598,-1.498 3.598,-1.498 ; -3.598,1.498 3.598,1.498 ; 3.598,-1.498 4,-1.9 ; 3.598,-1.498 3.598,1.498 ; 3.598,1.498 4,1.9 ; 4,-1.9 4,1.9
4-TopCourty:
  circle w0.1: c0,0 r0.4
  lines w0.05: -4.3,-2.8 -4.3,2.8 4.2,2.8 4.2,-2.8 -4.3,-2.8
  lines w0.1: -0.55,0 0.55,0 ; 0,-0.55 0,0.55
7-TopAssy:
  lines w0.127: -3.001,1.9 -3.001,1.91 -2.5,1.91 -2.5,1.9 ; -3,-1.9 -3,-1.91 -2.5,-1.91 -2.5,-1.9 ; 2.498,1.9 2.498,1.91 3,1.91 3,1.9 ; 2.5,-1.9 2.5,-1.91 3,-1.91 3,-1.9 ; -4,-1.9 4,-1.9 ; -4,-1.9 -4,1.9 ; -4,-1.9 -3.598,-1.498 ; -4,1.9 4,1.9 ; -4,1.9 -3.598,1.498 ; -3.598,-1.498 3.598,-1.498 ; -3.598,-1.498 -3.598,1.498 ; -3.598,1.498 3.598,1.498 ; 3.598,-1.498 3.598,1.498 ; 3.598,-1.498 4,-1.9 ; 3.598,1.498 4,1.9 ; 4,-1.9 4,1.9
  text ".Designator" at -1.6,-0.3 h1.5
  text "1" at -3,-1.2 h1.52
13-SMDTopOverlay:
  lines w0.2: -3.8,-2.1 -4.3,-2.1 -4.3,2.1 -3.8,2.1 ; -1.7,-2.1 1.7,-2.1 ; -1.7,2.1 1.7,2.1 ; 3.8,-2.1 4.1,-2.1 4.1,2.1 3.8,2.1
  text "1" at -4.1,-1.7 h1.52
3D body "XTAL_MC-306_PANASONIC.STEP": height 2.55, standoff 0, extent -4,-1.9 4,1.92

## XTAL_ECX64A_ECS-INC [mm] "ECS Inc crystal ECX-64A Package 6.0x3.5mm"
height 1.1
pads (2):
  rect 1.9x2.4 smd: 1(-2.25,0) 2(2.25,0)
2-TopCompOutl:
  lines w0.127: -3.1,-1.85 -3.1,1.85 3.1,1.85 3.1,-1.85 -3.1,-1.85
4-TopCourty:
  circle w0.1: c0,0 r0.4
  lines w0.05: -3.5,-2.2 -3.5,2.2 3.5,2.2 3.5,-2.2 -3.5,-2.2
  lines w0.1: -0.55,0 0.55,0 ; 0,-0.55 0,0.55
7-TopAssy:
  lines w0.127: -3.1,-1.85 3.1,-1.85 3.1,1.85 -3.1,1.85 -3.1,-1.85
  text ".Designator" at -1.6,-0.3 h1.5
13-SMDTopOverlay:
  lines w0.2: -3.1,-2.2 3.1,-2.2 ; -3.1,2.2 3.1,2.2
3D body "XTAL_ECX64A_ECS-INC.STEP": height 1.1, standoff -0.01, extent -3.1,-1.875 3.1,1.825

## XTAL_TXC_7A_5X3.2mm [mm] "TXC Crystal 7A Series SMD-PKG-5.0x3.2mm"
height 1.35
pads (2):
  rect 1.7x2.4 smd: 1(-1.85,0) 2(1.85,0)
2-TopCompOutl:
  lines w0.127: -2.6,-1.7 2.6,-1.7 2.6,1.7 -2.6,1.7 -2.6,-1.7
4-TopCourty:
  circle w0.1: c0,0 r0.4
  lines w0.05: -2.775,-1.8 2.775,-1.8 2.775,1.8 -2.775,1.8 -2.775,-1.8
  lines w0.1: -0.55,0 0.55,0 ; 0,-0.55 0,0.55
7-TopAssy:
  lines w0.127: -2.323,-1.423 -2.25,-1.35 ; -2.323,1.423 -2.25,1.35 ; 2.323,-1.423 2.25,-1.35 ; 2.323,1.423 2.25,1.35 ; -2.25,-1.35 2.25,-1.35 ; -2.25,-1.35 -2.25,1.35 ; -2.25,1.35 2.25,1.35 ; 2.25,-1.35 2.25,1.35 ; -2.5,-1.35 cw(c-2.5,-1.6) -2.25,-1.6 2.25,-1.6 cw(c2.5,-1.6) 2.5,-1.35 2.5,-0.7 2.3,-0.5 2.3,0.5 2.5,0.7 2.5,1.35 cw(c2.5,1.6) 2.25,1.6 -2.25,1.6 cw(c-2.5,1.6) -2.5,1.35 -2.5,0.7 -2.3,0.5 -2.3,-0.5 -2.5,-0.7 -2.5,-1.35
  text ".Designator" at -1.6,-0.3 h1.5
13-SMDTopOverlay:
  lines w0.2: -2.7,1.7 2.675,1.7 ; -2.675,-1.7 2.675,-1.7
3D body "XTAL_TXC_7A_5X3.2mm.STEP": height 1.35, standoff 0, extent -2.5,-1.6 2.5,1.6